# Altium footprint library 3D封装库.PcbLib: 716 footprints (part 1 of 45)
Each footprint in its own frame and in the unit in brackets; x right, y up, seen from the top. Pads: shape width x height; smd on the part's side, far side on the other; paste and mask are expansions set on the pad; w line width, h text height; cw(c..) or ccw(c..) is an arc to the next point about the centre after c.
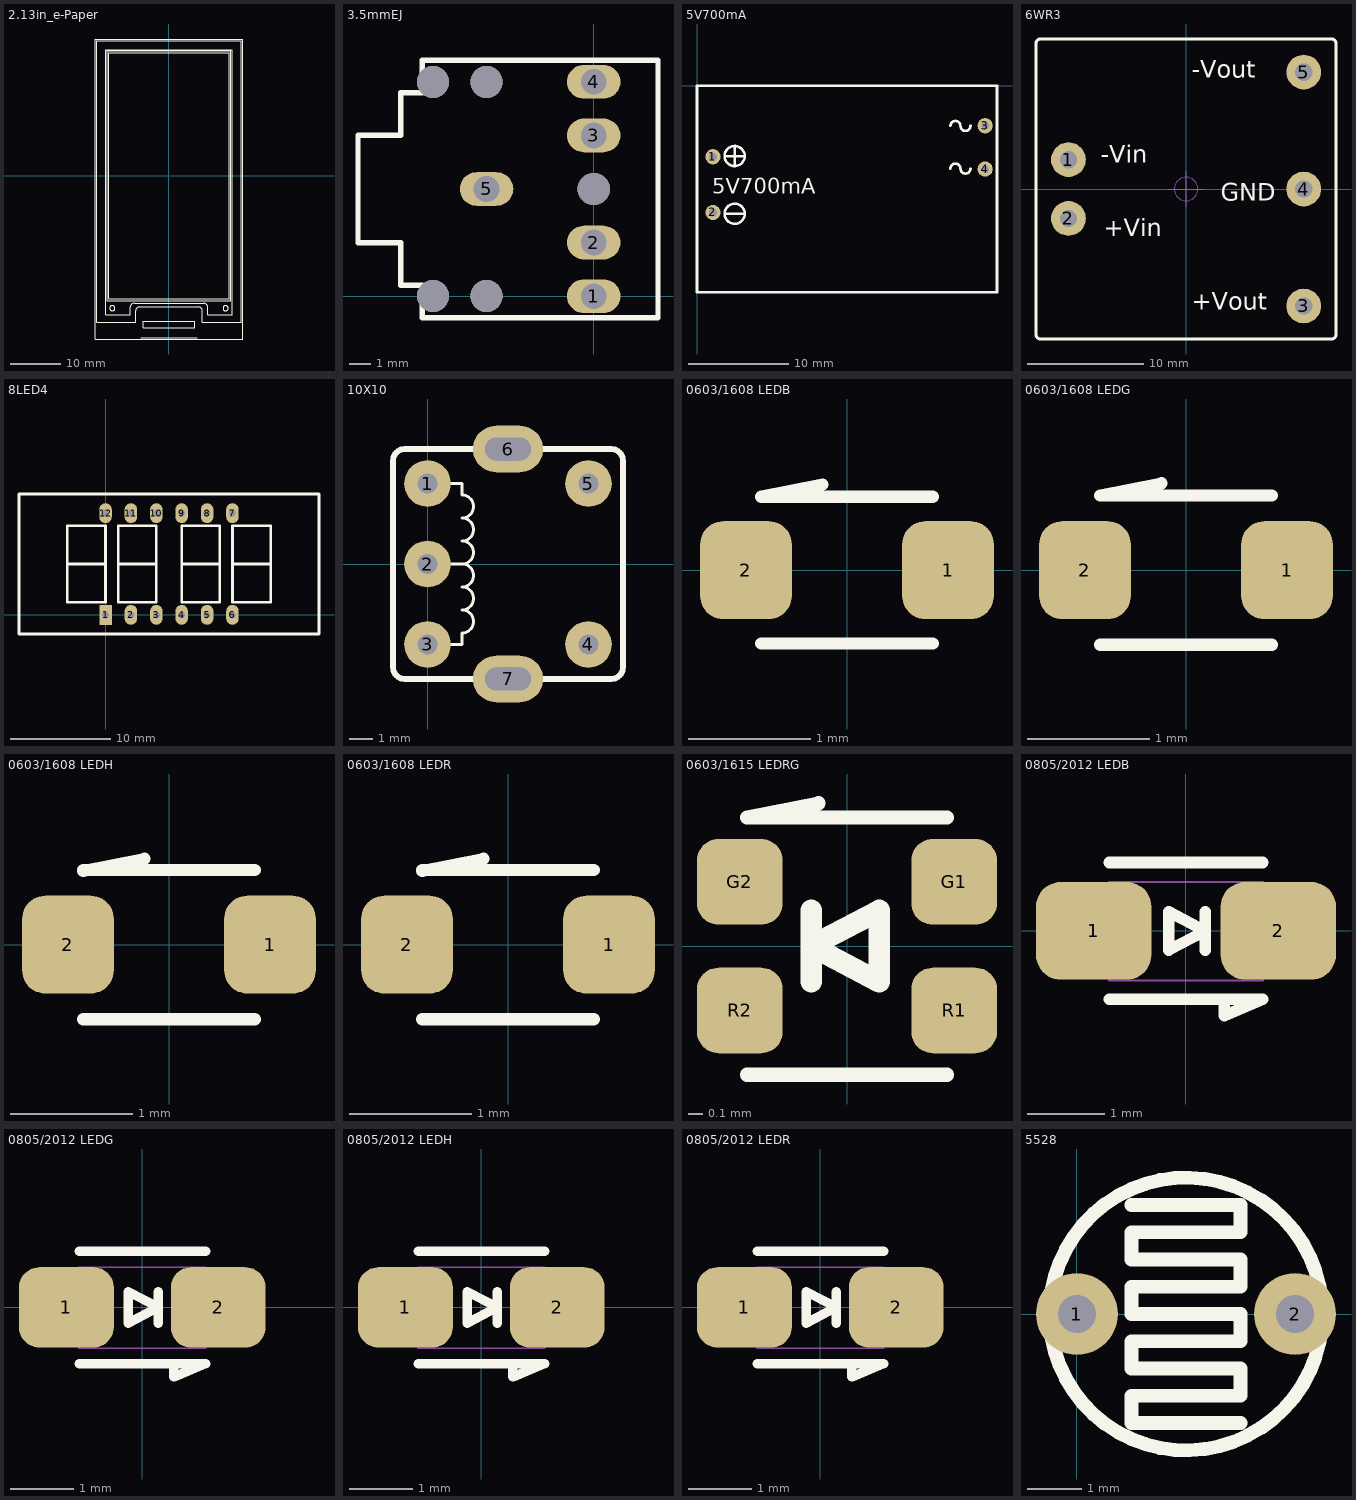
[diagram p0: the footprints below, top view; thin cyan lines are the x and y axes]

## 2.13in_e-Paper [mm] "2.13寸墨水屏"
Top Overlay:
  circle w0.203: c-11.176,-26.162 r0.508
  circle w0.203: c11.176,-26.162 r0.508
  lines w0.203: -5.588,-32.004 5.588,-32.004 ; -14.595,-32.225 -14.595,26.975 14.605,26.975 14.605,-32.225 -14.595,-32.225 ; -14.224,-28.956 -14.224,26.67 14.224,26.67 14.224,-28.956 6.604,-28.956 6.604,-26.67 ccw(c5.842,-26.67) 5.842,-25.908 -5.842,-25.908 ccw(c-5.842,-26.67) -6.604,-26.67 -6.604,-28.956 -14.224,-28.956 ; -12.446,-27.432 -12.446,24.892 12.446,24.892 12.446,-27.432 7.62,-27.432 7.62,-25.908 ccw(c6.858,-25.908) 6.858,-25.146 -6.858,-25.146 ccw(c-6.858,-25.908) -7.62,-25.908 -7.62,-27.432 -12.446,-27.432 ; -12.192,-24.638 -12.192,24.638 12.192,24.638 12.192,-24.638 -12.192,-24.638 ; -11.855,-24.275 -11.855,24.275 11.855,24.275 11.855,-24.275 -11.855,-24.275 ; -5.08,-29.972 5.08,-29.972 5.08,-28.702 -5.08,-28.702 -5.08,-29.972

## 3.5mmEJ [mm]
pads (5):
  oval 2.5x1.575 hole 1.2: 1(0,0) 2(0,2.5) 3(0,7.5) 4(0,10) 5(-5,5)
via 0,5 diameter 1.5 hole 1.5
via -5,0 diameter 1.5 hole 1.5
via -7.5,0 diameter 1.5 hole 1.5
via -5,10 diameter 1.5 hole 1.5
via -7.5,10 diameter 1.5 hole 1.5
Top Overlay:
  lines w0.254: -11,2.5 -9,2.5 -9,0.5 -8,0.5 -8,-1 3,-1 3,11 -8,11 -8,9.5 -9,9.5 -9,7.5 -11,7.5 -11,2.5

## 5V700mA [mil]
pads (4):
  round 60 hole 30: 1(62.6,-278.35) 2(62.6,-496.85) 3(1130.32,-156.69) 4(1130.32,-326.77)
Top Overlay:
  circle w10: c147.64,-501.97 r39.37
  circle w10: c147.64,-275.59 r39.37
  lines w10: 108.27,-501.97 187.01,-501.97 ; 108.27,-275.59 187.01,-275.59 ; 147.64,-314.96 147.64,-236.22 ; 994.09,-324.8 cw(c1013.78,-324.8) 1033.46,-324.8 ccw(c1053.15,-324.8) 1072.83,-324.8 ; 994.09,-157.48 cw(c1013.78,-157.48) 1033.46,-157.48 ccw(c1053.15,-157.48) 1072.83,-157.48 ; 0,-809.84 1176.77,-809.84 1176.77,0 0,0 0,-809.84
  text "5V700mA" at 59.06,-423.23 h60

## 6WR3 [mm]
pads (5):
  round 3 hole 1.5: 1(-10.15,2.538) 2(-10.15,-2.542) 3(10.17,-10.102) 4(10.17,-0.002) 5(10.17,10.098)
Top Overlay:
  lines w0.254: -12.954,-12.573 ccw(c-12.573,-12.573) -12.573,-12.954 12.573,-12.954 ccw(c12.573,-12.573) 12.954,-12.573 12.954,12.573 ccw(c12.573,12.573) 12.573,12.954 -12.573,12.954 ccw(c-12.573,12.573) -12.954,12.573 -12.954,-12.573
  text "-Vout" at 0.508,9.586 h1.52
  text "+Vin" at -7.112,-4.064 h1.52
  text "-Vin" at -7.366,2.286 h1.52
  text "GND" at 3,-1 h1.52
  text "+Vout" at 0.508,-10.414 h1.52
Mechanical 15:
  circle w0.1: c0,0 r1.016
  lines w0.1: -1.524,0 1.524,0 ; 0,-1.524 0,1.524
3D body "WD3-24S05A1.STEP": height 8.6, standoff -3.1, extent -12.75,-12.75 12.75,12.75

## 8LED4 [mm]
pads (12):
  rect 1.25x2 hole 0.7: 1(0,0)
  oval 1.25x2 hole 0.7: 2(2.54,0) 3(5.08,0) 4(7.62,0) 5(10.16,0) 6(12.7,0) 7(12.7,10.16) 8(10.16,10.16) 9(7.62,10.16) 10(5.08,10.16) 11(2.54,10.16) 12(0,10.16)
Top Overlay:
  lines w0.254: -3.81,5.08 0,5.08 ; 1.27,5.08 5.08,5.08 ; 7.62,5.08 11.43,5.08 ; 12.7,5.08 16.51,5.08 ; -8.65,-1.92 21.35,-1.92 21.35,12.08 -8.65,12.08 -8.65,-1.92 ; -3.81,1.27 0,1.27 0,8.89 -3.81,8.89 -3.81,1.27 ; 1.27,1.27 1.27,8.89 5.08,8.89 5.08,1.27 1.27,1.27 ; 7.62,1.27 11.43,1.27 11.43,8.89 7.62,8.89 7.62,1.27 ; 12.7,1.27 12.7,8.89 16.51,8.89 16.51,1.27 12.7,1.27

## 10X10 [mil]
pads (7):
  round 80 hole 35: 1(0,137.79) 2(0,0) 3(0,-137.79) 4(275.59,-137.79) 5(275.59,137.79)
  oval 120x80 hole 39.37 slot 78.74 at 0 deg: 6(137.79,196.85) 7(137.79,-196.85)
Top Overlay:
  lines w5: 39.37,-137.8 59.05,-137.8 59.05,-118.11 ccw(c59.05,-98.43) 59.05,-78.74 ccw(c59.05,-59.06) 59.05,-39.37 ccw(c59.05,-19.68) 59.05,0 ; 39.37,0 59.05,0 ; 39.37,137.8 59.05,137.8 59.05,118.11 cw(c59.05,98.43) 59.05,78.74 cw(c59.05,59.06) 59.05,39.37 cw(c59.05,19.68) 59.05,0
  lines w10: -59.06,-177.17 ccw(c-39.37,-177.17) -39.37,-196.85 ; -59.06,-176.96 -59.06,177.37 ; -59.06,177.17 cw(c-39.37,177.17) -39.37,196.85 ; -39.62,-196.85 98.17,-196.85 ; -39.62,196.85 98.17,196.85 ; 176.91,-196.65 314.71,-196.65 ; 176.91,197.06 314.71,197.06 ; 314.96,-196.85 ccw(c314.96,-177.17) 334.65,-177.17 ; 314.96,196.85 cw(c314.96,177.17) 334.65,177.17 ; 334.65,-176.96 334.65,177.37

## 0603/1608 LEDB [mm]
height 3.1
pads (2):
  rrect50% 0.75x0.8 smd: 1(0.826,0) 2(-0.826,0)
Top Overlay:
  lines w0.1: -0.7,-0.6 0.7,-0.6 ; -0.2,0.7 -0.7,0.6 0.7,0.6
3D body "0_8128-0_762-0603.stp": height 0.02, standoff 0, extent 0.445,-0.406 1.206,0.406
3D body "0_8128-0_762-0603.stp": height 0.02, standoff 0, extent -1.206,-0.406 -0.445,0.406
3D body "0603-ledb.stp": height 0.35, standoff 0, extent -0.8,-0.4 0.8,0.4

## 0603/1608 LEDG [mm] "Kingbright,1608,LED,400 mcd 120*"
height 3.1
pads (2):
  rrect50% 0.75x0.8 smd: 1(0.826,0) 2(-0.826,0)
Top Overlay:
  lines w0.1: -0.7,-0.61 0.7,-0.61 ; -0.2,0.71 -0.7,0.61 0.7,0.61
3D body "0_8128-0_762-0603.stp": height 0.02, standoff 0, extent 0.445,-0.406 1.206,0.406
3D body "0_8128-0_762-0603.stp": height 0.02, standoff 0, extent -1.206,-0.406 -0.445,0.406
3D body "0603-ledg.stp": height 0.35, standoff 0, extent -0.8,-0.4 0.8,0.4

## 0603/1608 LEDH [mm]
height 3.1
pads (2):
  rrect50% 0.75x0.8 smd: 1(0.826,0) 2(-0.826,0)
Top Overlay:
  lines w0.1: -0.7,-0.61 0.7,-0.61 ; -0.7,0.6 -0.2,0.7 ; -0.7,0.61 0.7,0.61
3D body "0_8128-0_762-0603.stp": height 0.02, standoff 0, extent -1.206,-0.406 -0.445,0.406
3D body "0_8128-0_762-0603.stp": height 0.02, standoff 0, extent 0.445,-0.406 1.206,0.406
3D body "0603-led-y.stp": height 0.79, standoff 0, extent -0.8,-0.4 0.8,0.4

## 0603/1608 LEDR [mm]
height 3.1
pads (2):
  rrect50% 0.75x0.8 smd: 1(0.826,0) 2(-0.826,0)
Top Overlay:
  lines w0.1: -0.7,-0.61 0.7,-0.61 ; -0.7,0.6 -0.2,0.7 ; -0.7,0.61 0.7,0.61
3D body "0_8128-0_762-0603.stp": height 0.02, standoff 0, extent -1.206,-0.406 -0.445,0.406
3D body "0_8128-0_762-0603.stp": height 0.02, standoff 0, extent 0.445,-0.406 1.206,0.406
3D body "0603-led-r.stp": height 0.79, standoff 0, extent -0.8,-0.4 0.8,0.4

## 0603/1615 LEDRG [mm]
height 3.1
pads (4):
  rrect50% 0.6x0.6 smd: G1(0.75,0.45) G2(-0.75,0.45) R1(0.75,-0.45) R2(-0.75,-0.45)
Top Overlay:
  lines w0.1: -0.7,-0.9 0.7,-0.9 ; -0.2,1 -0.7,0.9 0.7,0.9
  lines w0.15: -0.25,-0.25 -0.25,0.25 ; -0.25,0 0.225,0.25 0.225,-0.25 -0.25,0
3D body "User Library-KPTB-1615SURKSGC.STEP": height 0.7, standoff -0.01, extent -0.8,-0.75 0.8,0.75

## 0805/2012 LEDB [mm]
height 3.1
pads (2):
  rrect50% 1.5x1.27 smd: 1(-1.2,0)
  rrect50% 1.5x1.27 smd mask+0.07: 2(1.2,0)
Top Overlay:
  lines w0.15: -1,-0.889 1,-0.889 ; -1,0.889 1,0.889 ; 0.25,-0.25 0.25,0.25 ; 0.5,-1.1 1,-0.889 ; 0.5,-0.889 1,-0.889 ; 0.5,-0.889 0.5,-1.097 0.5,-0.889 ; -0.225,-0.25 -0.225,0.25 0.25,0 -0.225,-0.25
Mechanical 15:
  lines w0.025: -1.003,-0.648 1.003,-0.648 1.003,0.635 -1.003,0.635 -1.003,-0.648
3D body "0805_1016_127.stp": height 0.01, standoff 0, extent 0.892,-0.635 1.908,0.635
3D body "0805_1016_127.stp": height 0.01, standoff 0, extent -1.908,-0.635 -0.892,0.635
3D body "0805B.stp": height 1.09, standoff 0, extent -1,-0.625 1,0.625

## 0805/2012 LEDG [mm]
height 3.1
pads (2):
  rrect50% 1.5x1.27 smd: 1(-1.2,0)
  rrect50% 1.5x1.27 smd mask+0.07: 2(1.2,0)
Top Overlay:
  lines w0.15: -1,-0.889 1,-0.889 ; -1,0.889 1,0.889 ; 0.25,-0.25 0.25,0.25 ; 0.5,-1.1 1,-0.889 ; 0.5,-0.889 0.5,-1.097 0.5,-0.889 ; 0.5,-0.889 1,-0.889 ; -0.225,-0.25 0.25,0 -0.225,0.25 -0.225,-0.25
Mechanical 15:
  lines w0.025: -1.003,-0.648 -1.003,0.635 1.003,0.635 1.003,-0.648 -1.003,-0.648
3D body "0805_1016_127.stp": height 0.01, standoff 0, extent 0.9,-0.635 1.916,0.635
3D body "0805_1016_127.stp": height 0.01, standoff 0, extent -1.908,-0.635 -0.892,0.635
3D body "0805G.stp": height 1.09, standoff 0, extent -1,-0.625 1,0.625

## 0805/2012 LEDH [mm]
height 3.1
pads (2):
  rrect50% 1.5x1.27 smd: 1(-1.2,0)
  rrect50% 1.5x1.27 smd mask+0.07: 2(1.2,0)
Top Overlay:
  lines w0.15: -1,-0.889 1,-0.889 ; -1,0.889 1,0.889 ; 0.25,-0.25 0.25,0.25 ; 0.5,-1.1 1,-0.889 ; 0.5,-0.889 0.5,-1.097 0.5,-0.889 ; 0.5,-0.889 1,-0.889 ; -0.225,-0.25 0.25,0 -0.225,0.25 -0.225,-0.25
Mechanical 15:
  lines w0.025: -1.003,-0.648 -1.003,0.635 1.003,0.635 1.003,-0.648 -1.003,-0.648
3D body "0805_1016_127.stp": height 0.01, standoff 0, extent -1.908,-0.635 -0.892,0.635
3D body "0805_1016_127.stp": height 0.01, standoff 0, extent 0.892,-0.635 1.908,0.635
3D body "0805h.stp": height 1.09, standoff 0, extent -1,-0.625 1,0.625

## 0805/2012 LEDR [mm]
height 3.1
pads (2):
  rrect50% 1.5x1.27 smd: 1(-1.2,0)
  rrect50% 1.5x1.27 smd mask+0.07: 2(1.2,0)
Top Overlay:
  lines w0.15: -1,-0.889 1,-0.889 ; -1,0.889 1,0.889 ; 0.25,-0.25 0.25,0.25 ; 0.5,-1.1 1,-0.889 ; 0.5,-0.889 1,-0.889 ; 0.5,-0.889 0.5,-1.097 0.5,-0.889 ; -0.225,-0.25 -0.225,0.25 0.25,0 -0.225,-0.25
Mechanical 15:
  lines w0.025: -1.003,-0.648 1.003,-0.648 1.003,0.635 -1.003,0.635 -1.003,-0.648
3D body "0805_1016_127.stp": height 0.01, standoff 0, extent -1.908,-0.635 -0.892,0.635
3D body "0805_1016_127.stp": height 0.01, standoff 0, extent 0.892,-0.635 1.908,0.635
3D body "0805R.stp": height 1.09, standoff 0, extent -1,-0.625 1,0.625

## 5528 [mm]
pads (2):
  round 1.5 hole 0.7: 1(0,0) 2(4,0)
Top Overlay:
  circle w0.254: c2,0 r2.5
  lines w0.254: 1,2 3,2 3,1.5 1,1.5 1,1 3,1 3,0.5 1,0.5 1,0 3,0 3,-0.5 1,-0.5 1,-1 3,-1 3,-1.5 1,-1.5 1,-2 3,-2